# Altium schematic symbol library jlcpcb_2025_04_capacitors_extended_0805.schlib: 3281 symbols (part 14 of 18) (continued)
## GCM216R71H223JA37D
designator C?  Capacitance: 22nF  (hidden comment: *)
Capacitor, Ceramic (MLCC), 22nF, ±5%, 50V, X7R, ±5%, SMD 0805; Manufacturer: Murata Electronics; Manufacturer Part Number: GCM216R71H223JA37D; Package Size: 0805; JLCPCB Basic Part: No; JLCPCB Part Number: C437478; Supplier 1: LCSC; Category: Capacitors - MLCC; Supplier Part Number 1: C437478; Tolerance: ±5%; Voltage Rating: 50V; Temperature Coefficient: X7R; RoHS: Yes; ComponentLink1Description: Datasheet; ComponentLink1URL: https://wmsc.lcsc.com/wmsc/upload/file/pdf/v2/lcsc/2304140030_Murata-Electronics-GCM216R71H223JA37D_C437478.pdf; ComponentLink2Description: JLCPCB Part URL; ComponentLink2URL: https://jlcpcb.com/partdetail/C437478; ComponentLink3Description: LCSC Part URL; ComponentLink3URL: https://lcsc.com/product-detail/Multilayer-Ceramic-Capacitors-MLCC---SMD-SMT_Murata-Electronics-Murata-Electronics-GCM216R71H223JA37D_C437478.html
footprint CAP-0805 (0805 (2012M) Capacitor)
pins: 1, 2

## GCM216R71H223KA37D
designator C?  Capacitance: 22nF  (hidden comment: *)
Capacitor, Ceramic (MLCC), 22nF, ±10%, 50V, X7R, ±10%, SMD 0805; Manufacturer: Murata Electronics; Manufacturer Part Number: GCM216R71H223KA37D; Package Size: 0805; JLCPCB Basic Part: No; JLCPCB Part Number: C343871; Supplier 1: LCSC; Category: Capacitors - MLCC; Supplier Part Number 1: C343871; Tolerance: ±10%; Voltage Rating: 50V; Temperature Coefficient: X7R; RoHS: Yes; ComponentLink1Description: Datasheet; ComponentLink1URL: https://wmsc.lcsc.com/wmsc/upload/file/pdf/v2/lcsc/1912111437_Murata-Electronics-GCM216R71H223KA37D_C343871.pdf; ComponentLink2Description: JLCPCB Part URL; ComponentLink2URL: https://jlcpcb.com/partdetail/C343871; ComponentLink3Description: LCSC Part URL; ComponentLink3URL: https://lcsc.com/product-detail/Multilayer-Ceramic-Capacitors-MLCC---SMD-SMT_Murata-Electronics-Murata-Electronics-GCM216R71H223KA37D_C343871.html
footprint CAP-0805 (0805 (2012M) Capacitor)
pins: 1, 2

## GCM216R72A103KA37D
designator C?  Capacitance: 10nF  (hidden comment: *)
Capacitor, Ceramic (MLCC), 10nF, ±10%, 100V, X7R, ±10%, SMD 0805; Manufacturer: Murata Electronics; Manufacturer Part Number: GCM216R72A103KA37D; Package Size: 0805; JLCPCB Basic Part: No; JLCPCB Part Number: C469523; Supplier 1: LCSC; Category: Capacitors - MLCC; Supplier Part Number 1: C469523; Tolerance: ±10%; Voltage Rating: 100V; Temperature Coefficient: X7R; RoHS: Yes; ComponentLink1Description: Datasheet; ComponentLink1URL: https://wmsc.lcsc.com/wmsc/upload/file/pdf/v2/lcsc/1912251532_Murata-Electronics-GCM216R72A103KA37D_C469523.pdf; ComponentLink2Description: JLCPCB Part URL; ComponentLink2URL: https://jlcpcb.com/partdetail/C469523; ComponentLink3Description: LCSC Part URL; ComponentLink3URL: https://lcsc.com/product-detail/Multilayer-Ceramic-Capacitors-MLCC---SMD-SMT_Murata-Electronics-Murata-Electronics-GCM216R72A103KA37D_C469523.html
footprint CAP-0805 (0805 (2012M) Capacitor)
pins: 1, 2

## GCM216R72A223KA37D
designator C?  Capacitance: 22nF  (hidden comment: *)
Capacitor, Ceramic (MLCC), 22nF, ±10%, 100V, X7R, ±10%, SMD 0805; Manufacturer: Murata Electronics; Manufacturer Part Number: GCM216R72A223KA37D; Package Size: 0805; JLCPCB Basic Part: No; JLCPCB Part Number: C184772; Supplier 1: LCSC; Category: Capacitors - MLCC; Supplier Part Number 1: C184772; Tolerance: ±10%; Voltage Rating: 100V; Temperature Coefficient: X7R; RoHS: Yes; ComponentLink1Description: Datasheet; ComponentLink1URL: https://wmsc.lcsc.com/wmsc/upload/file/pdf/v2/lcsc/1912111437_Murata-Electronics-GCM216R72A223KA37D_C184772.pdf; ComponentLink2Description: JLCPCB Part URL; ComponentLink2URL: https://jlcpcb.com/partdetail/C184772; ComponentLink3Description: LCSC Part URL; ComponentLink3URL: https://lcsc.com/product-detail/Multilayer-Ceramic-Capacitors-MLCC---SMD-SMT_Murata-Electronics-Murata-Electronics-GCM216R72A223KA37D_C184772.html
footprint CAP-0805 (0805 (2012M) Capacitor)
pins: 1, 2

## GCM219R71C105KA37D
designator C?  Capacitance: 1uF  (hidden comment: *)
Capacitor, Ceramic (MLCC), 1uF, ±10%, 16V, X7R, ±10%, SMD 0805; Manufacturer: Murata Electronics; Manufacturer Part Number: GCM219R71C105KA37D; Package Size: 0805; JLCPCB Basic Part: No; JLCPCB Part Number: C2167390; Supplier 1: LCSC; Category: Capacitors - MLCC; Supplier Part Number 1: C2167390; Tolerance: ±10%; Voltage Rating: 16V; Temperature Coefficient: X7R; RoHS: Yes; ComponentLink1Description: Datasheet; ComponentLink1URL: https://wmsc.lcsc.com/wmsc/upload/file/pdf/v2/lcsc/2308111607_Murata-Electronics-GCM219R71C105KA37D_C2167390.pdf; ComponentLink2Description: JLCPCB Part URL; ComponentLink2URL: https://jlcpcb.com/partdetail/C2167390; ComponentLink3Description: LCSC Part URL; ComponentLink3URL: https://lcsc.com/product-detail/Multilayer-Ceramic-Capacitors-MLCC---SMD-SMT_Murata-Electronics-Murata-Electronics-GCM219R71C105KA37D_C2167390.html
footprint CAP-0805 (0805 (2012M) Capacitor)
pins: 1, 2

## GCM219R71E474KA55D
designator C?  Capacitance: 470nF  (hidden comment: *)
Capacitor, Ceramic (MLCC), 470nF, ±10%, 25V, X7R, ±10%, SMD 0805; Manufacturer: Murata Electronics; Manufacturer Part Number: GCM219R71E474KA55D; Package Size: 0805; JLCPCB Basic Part: No; JLCPCB Part Number: C437481; Supplier 1: LCSC; Category: Capacitors - MLCC; Supplier Part Number 1: C437481; Tolerance: ±10%; Voltage Rating: 25V; Temperature Coefficient: X7R; RoHS: Yes; ComponentLink1Description: Datasheet; ComponentLink1URL: https://wmsc.lcsc.com/wmsc/upload/file/pdf/v2/lcsc/2304140030_Murata-Electronics-GCM219R71E474KA55D_C437481.pdf; ComponentLink2Description: JLCPCB Part URL; ComponentLink2URL: https://jlcpcb.com/partdetail/C437481; ComponentLink3Description: LCSC Part URL; ComponentLink3URL: https://lcsc.com/product-detail/Multilayer-Ceramic-Capacitors-MLCC---SMD-SMT_Murata-Electronics-Murata-Electronics-GCM219R71E474KA55D_C437481.html
footprint CAP-0805 (0805 (2012M) Capacitor)
pins: 1, 2

## GCM219R71H333KA37D
designator C?  Capacitance: 33nF  (hidden comment: *)
Capacitor, Ceramic (MLCC), 33nF, ±10%, 50V, X7R, ±10%, SMD 0805; Manufacturer: Murata Electronics; Manufacturer Part Number: GCM219R71H333KA37D; Package Size: 0805; JLCPCB Basic Part: No; JLCPCB Part Number: C437482; Supplier 1: LCSC; Category: Capacitors - MLCC; Supplier Part Number 1: C437482; Tolerance: ±10%; Voltage Rating: 50V; Temperature Coefficient: X7R; RoHS: Yes; ComponentLink1Description: Datasheet; ComponentLink1URL: https://wmsc.lcsc.com/wmsc/upload/file/pdf/v2/lcsc/2304140030_Murata-Electronics-GCM219R71H333KA37D_C437482.pdf; ComponentLink2Description: JLCPCB Part URL; ComponentLink2URL: https://jlcpcb.com/partdetail/C437482; ComponentLink3Description: LCSC Part URL; ComponentLink3URL: https://lcsc.com/product-detail/Multilayer-Ceramic-Capacitors-MLCC---SMD-SMT_Murata-Electronics-Murata-Electronics-GCM219R71H333KA37D_C437482.html
footprint CAP-0805 (0805 (2012M) Capacitor)
pins: 1, 2

## GCM219R71H334KA55D
designator C?  Capacitance: 330nF  (hidden comment: *)
Capacitor, Ceramic (MLCC), 330nF, ±10%, 50V, X7R, ±10%, SMD 0805; Manufacturer: Murata Electronics; Manufacturer Part Number: GCM219R71H334KA55D; Package Size: 0805; JLCPCB Basic Part: No; JLCPCB Part Number: C161253; Supplier 1: LCSC; Category: Capacitors - MLCC; Supplier Part Number 1: C161253; Tolerance: ±10%; Voltage Rating: 50V; Temperature Coefficient: X7R; RoHS: Yes; ComponentLink1Description: Datasheet; ComponentLink1URL: https://wmsc.lcsc.com/wmsc/upload/file/pdf/v2/lcsc/1810251040_Murata-Electronics-GCM219R71H334KA55D_C161253.pdf; ComponentLink2Description: JLCPCB Part URL; ComponentLink2URL: https://jlcpcb.com/partdetail/C161253; ComponentLink3Description: LCSC Part URL; ComponentLink3URL: https://lcsc.com/product-detail/Multilayer-Ceramic-Capacitors-MLCC---SMD-SMT_Murata-Electronics-Murata-Electronics-GCM219R71H334KA55D_C161253.html
footprint CAP-0805 (0805 (2012M) Capacitor)
pins: 1, 2

## GCM219R72A102KA37D
designator C?  Capacitance: 1nF  (hidden comment: *)
Capacitor, Ceramic (MLCC), 1nF, ±10%, 100V, X7R, ±10%, SMD 0805; Manufacturer: Murata Electronics; Manufacturer Part Number: GCM219R72A102KA37D; Package Size: 0805; JLCPCB Basic Part: No; JLCPCB Part Number: C161254; Supplier 1: LCSC; Category: Capacitors - MLCC; Supplier Part Number 1: C161254; Tolerance: ±10%; Voltage Rating: 100V; Temperature Coefficient: X7R; RoHS: Yes; ComponentLink1Description: Datasheet; ComponentLink1URL: https://wmsc.lcsc.com/wmsc/upload/file/pdf/v2/lcsc/1810251040_Murata-Electronics-GCM219R72A102KA37D_C161254.pdf; ComponentLink2Description: JLCPCB Part URL; ComponentLink2URL: https://jlcpcb.com/partdetail/C161254; ComponentLink3Description: LCSC Part URL; ComponentLink3URL: https://lcsc.com/product-detail/Multilayer-Ceramic-Capacitors-MLCC---SMD-SMT_Murata-Electronics-Murata-Electronics-GCM219R72A102KA37D_C161254.html
footprint CAP-0805 (0805 (2012M) Capacitor)
pins: 1, 2

## GCM219R72A333KA37D
designator C?  Capacitance: 33nF  (hidden comment: *)
Capacitor, Ceramic (MLCC), 33nF, ±10%, 100V, X7R, ±10%, SMD 0805; Manufacturer: Murata Electronics; Manufacturer Part Number: GCM219R72A333KA37D; Package Size: 0805; JLCPCB Basic Part: No; JLCPCB Part Number: C161255; Supplier 1: LCSC; Category: Capacitors - MLCC; Supplier Part Number 1: C161255; Tolerance: ±10%; Voltage Rating: 100V; Temperature Coefficient: X7R; RoHS: Yes; ComponentLink1Description: Datasheet; ComponentLink1URL: https://wmsc.lcsc.com/wmsc/upload/file/pdf/v2/lcsc/1810251040_Murata-Electronics-GCM219R72A333KA37D_C161255.pdf; ComponentLink2Description: JLCPCB Part URL; ComponentLink2URL: https://jlcpcb.com/partdetail/C161255; ComponentLink3Description: LCSC Part URL; ComponentLink3URL: https://lcsc.com/product-detail/Multilayer-Ceramic-Capacitors-MLCC---SMD-SMT_Murata-Electronics-Murata-Electronics-GCM219R72A333KA37D_C161255.html
footprint CAP-0805 (0805 (2012M) Capacitor)
pins: 1, 2

## GCM219R91H103KA37D
designator C?  Capacitance: 10nF  (hidden comment: *)
Capacitor, Ceramic (MLCC), 10nF, ±10%, 50V, X8R, ±10%, SMD 0805; Manufacturer: Murata Electronics; Manufacturer Part Number: GCM219R91H103KA37D; Package Size: 0805; JLCPCB Basic Part: No; JLCPCB Part Number: C437483; Supplier 1: LCSC; Category: Capacitors - MLCC; Supplier Part Number 1: C437483; Tolerance: ±10%; Voltage Rating: 50V; Temperature Coefficient: X8R; RoHS: Yes; ComponentLink1Description: Datasheet; ComponentLink1URL: https://wmsc.lcsc.com/wmsc/upload/file/pdf/v2/lcsc/2304140030_Murata-Electronics-GCM219R91H103KA37D_C437483.pdf; ComponentLink2Description: JLCPCB Part URL; ComponentLink2URL: https://jlcpcb.com/partdetail/C437483; ComponentLink3Description: LCSC Part URL; ComponentLink3URL: https://lcsc.com/product-detail/Multilayer-Ceramic-Capacitors-MLCC---SMD-SMT_Murata-Electronics-Murata-Electronics-GCM219R91H103KA37D_C437483.html
footprint CAP-0805 (0805 (2012M) Capacitor)
pins: 1, 2

## GCM219R92A223KA37D
designator C?  Capacitance: 22nF  (hidden comment: *)
Capacitor, Ceramic (MLCC), 22nF, ±10%, 100V, ±10%, SMD 0805; Manufacturer: Murata Electronics; Manufacturer Part Number: GCM219R92A223KA37D; Package Size: 0805; JLCPCB Basic Part: No; JLCPCB Part Number: C1517528; Supplier 1: LCSC; Category: Capacitors - MLCC; Supplier Part Number 1: C1517528; Tolerance: ±10%; Voltage Rating: 100V; RoHS: Yes; ComponentLink1Description: Datasheet; ComponentLink1URL: https://wmsc.lcsc.com/wmsc/upload/file/pdf/v2/lcsc/2108202030_Murata-Electronics-GCM219R92A223KA37D_C1517528.pdf; ComponentLink2Description: JLCPCB Part URL; ComponentLink2URL: https://jlcpcb.com/partdetail/C1517528; ComponentLink3Description: LCSC Part URL; ComponentLink3URL: https://lcsc.com/product-detail/Multilayer-Ceramic-Capacitors-MLCC---SMD-SMT_Murata-Electronics-Murata-Electronics-GCM219R92A223KA37D_C1517528.html
footprint CAP-0805 (0805 (2012M) Capacitor)
pins: 1, 2

## GCM2162C2A152JA01D
designator C?  Capacitance: 1.5nF  (hidden comment: *)
Capacitor, Ceramic (MLCC), 1.5nF, ±5%, 100V, CH, ±5%, SMD 0805; Manufacturer: Murata Electronics; Manufacturer Part Number: GCM2162C2A152JA01D; Package Size: 0805; JLCPCB Basic Part: No; JLCPCB Part Number: C380381; Supplier 1: LCSC; Category: Capacitors - MLCC; Supplier Part Number 1: C380381; Tolerance: ±5%; Voltage Rating: 100V; Temperature Coefficient: CH; RoHS: Yes; ComponentLink1Description: Datasheet; ComponentLink1URL: https://wmsc.lcsc.com/wmsc/upload/file/pdf/v2/lcsc/2005291032_Murata-Electronics-GCM2162C2A152JA01D_C380381.pdf; ComponentLink2Description: JLCPCB Part URL; ComponentLink2URL: https://jlcpcb.com/partdetail/C380381; ComponentLink3Description: LCSC Part URL; ComponentLink3URL: https://lcsc.com/product-detail/Multilayer-Ceramic-Capacitors-MLCC---SMD-SMT_Murata-Electronics-Murata-Electronics-GCM2162C2A152JA01D_C380381.html
footprint CAP-0805 (0805 (2012M) Capacitor)
pins: 1, 2

## GCM2165C1H681JA16D
designator C?  Capacitance: 680pF  (hidden comment: *)
Capacitor, Ceramic (MLCC), 680pF, ±5%, 50V, C0G, ±5%, SMD 0805; Manufacturer: Murata Electronics; Manufacturer Part Number: GCM2165C1H681JA16D; Package Size: 0805; JLCPCB Basic Part: No; JLCPCB Part Number: C437471; Supplier 1: LCSC; Category: Capacitors - MLCC; Supplier Part Number 1: C437471; Tolerance: ±5%; Voltage Rating: 50V; Temperature Coefficient: C0G; RoHS: Yes; ComponentLink1Description: Datasheet; ComponentLink1URL: https://wmsc.lcsc.com/wmsc/upload/file/pdf/v2/lcsc/2304140030_Murata-Electronics-GCM2165C1H681JA16D_C437471.pdf; ComponentLink2Description: JLCPCB Part URL; ComponentLink2URL: https://jlcpcb.com/partdetail/C437471; ComponentLink3Description: LCSC Part URL; ComponentLink3URL: https://lcsc.com/product-detail/Multilayer-Ceramic-Capacitors-MLCC---SMD-SMT_Murata-Electronics-Murata-Electronics-GCM2165C1H681JA16D_C437471.html
footprint CAP-0805 (0805 (2012M) Capacitor)
pins: 1, 2

## GCM2165C2A221JA16D
designator C?  Capacitance: 220pF  (hidden comment: *)
Capacitor, Ceramic (MLCC), 220pF, ±5%, 100V, ±5%, SMD 0805; Manufacturer: Murata Electronics; Manufacturer Part Number: GCM2165C2A221JA16D; Package Size: 0805; JLCPCB Basic Part: No; JLCPCB Part Number: C701167; Supplier 1: LCSC; Category: Capacitors - MLCC; Supplier Part Number 1: C701167; Tolerance: ±5%; Voltage Rating: 100V; RoHS: Yes; ComponentLink1Description: Datasheet; ComponentLink1URL: https://wmsc.lcsc.com/wmsc/upload/file/pdf/v2/lcsc/2010051234_Murata-Electronics-GCM2165C2A221JA16D_C701167.pdf; ComponentLink2Description: JLCPCB Part URL; ComponentLink2URL: https://jlcpcb.com/partdetail/C701167; ComponentLink3Description: LCSC Part URL; ComponentLink3URL: https://lcsc.com/product-detail/Multilayer-Ceramic-Capacitors-MLCC---SMD-SMT_Murata-Electronics-Murata-Electronics-GCM2165C2A221JA16D_C701167.html
footprint CAP-0805 (0805 (2012M) Capacitor)
pins: 1, 2

## GCM2165C2A222JA16D
designator C?  Capacitance: 2.2nF  (hidden comment: *)
Capacitor, Ceramic (MLCC), 2.2nF, ±5%, 100V, C0G, ±5%, SMD 0805; Manufacturer: Murata Electronics; Manufacturer Part Number: GCM2165C2A222JA16D; Package Size: 0805; JLCPCB Basic Part: No; JLCPCB Part Number: C161241; Supplier 1: LCSC; Category: Capacitors - MLCC; Supplier Part Number 1: C161241; Tolerance: ±5%; Voltage Rating: 100V; Temperature Coefficient: C0G; RoHS: Yes; ComponentLink1Description: Datasheet; ComponentLink1URL: https://wmsc.lcsc.com/wmsc/upload/file/pdf/v2/lcsc/1810201252_Murata-Electronics-GCM2165C2A222JA16D_C161241.pdf; ComponentLink2Description: JLCPCB Part URL; ComponentLink2URL: https://jlcpcb.com/partdetail/C161241; ComponentLink3Description: LCSC Part URL; ComponentLink3URL: https://lcsc.com/product-detail/Multilayer-Ceramic-Capacitors-MLCC---SMD-SMT_Murata-Electronics-Murata-Electronics-GCM2165C2A222JA16D_C161241.html
footprint CAP-0805 (0805 (2012M) Capacitor)
pins: 1, 2

## GCM2165C2A471JA16D
designator C?  Capacitance: 470pF  (hidden comment: *)
Capacitor, Ceramic (MLCC), 470pF, ±5%, 100V, C0G, ±5%, SMD 0805; Manufacturer: Murata Electronics; Manufacturer Part Number: GCM2165C2A471JA16D; Package Size: 0805; JLCPCB Basic Part: No; JLCPCB Part Number: C437474; Supplier 1: LCSC; Category: Capacitors - MLCC; Supplier Part Number 1: C437474; Tolerance: ±5%; Voltage Rating: 100V; Temperature Coefficient: C0G; RoHS: Yes; ComponentLink1Description: Datasheet; ComponentLink1URL: https://wmsc.lcsc.com/wmsc/upload/file/pdf/v2/lcsc/2304140030_Murata-Electronics-GCM2165C2A471JA16D_C437474.pdf; ComponentLink2Description: JLCPCB Part URL; ComponentLink2URL: https://jlcpcb.com/partdetail/C437474; ComponentLink3Description: LCSC Part URL; ComponentLink3URL: https://lcsc.com/product-detail/Multilayer-Ceramic-Capacitors-MLCC---SMD-SMT_Murata-Electronics-Murata-Electronics-GCM2165C2A471JA16D_C437474.html
footprint CAP-0805 (0805 (2012M) Capacitor)
pins: 1, 2

## GCM2195C1H102JA16D
designator C?  Capacitance: 1nF  (hidden comment: *)
Capacitor, Ceramic (MLCC), 1nF, ±5%, 50V, C0G, ±5%, SMD 0805; Manufacturer: Murata Electronics; Manufacturer Part Number: GCM2195C1H102JA16D; Package Size: 0805; JLCPCB Basic Part: No; JLCPCB Part Number: C393688; Supplier 1: LCSC; Category: Capacitors - MLCC; Supplier Part Number 1: C393688; Tolerance: ±5%; Voltage Rating: 50V; Temperature Coefficient: C0G; RoHS: Yes; ComponentLink1Description: Datasheet; ComponentLink1URL: https://wmsc.lcsc.com/wmsc/upload/file/pdf/v2/lcsc/1912111437_Murata-Electronics-GCM2195C1H102JA16D_C393688.pdf; ComponentLink2Description: JLCPCB Part URL; ComponentLink2URL: https://jlcpcb.com/partdetail/C393688; ComponentLink3Description: LCSC Part URL; ComponentLink3URL: https://lcsc.com/product-detail/Multilayer-Ceramic-Capacitors-MLCC---SMD-SMT_Murata-Electronics-Murata-Electronics-GCM2195C1H102JA16D_C393688.html
footprint CAP-0805 (0805 (2012M) Capacitor)
pins: 1, 2

## GCM2195C1H103JA16D
designator C?  Capacitance: 10nF  (hidden comment: *)
Capacitor, Ceramic (MLCC), 10nF, ±5%, 50V, C0G, ±5%, SMD 0805; Manufacturer: Murata Electronics; Manufacturer Part Number: GCM2195C1H103JA16D; Package Size: 0805; JLCPCB Basic Part: No; JLCPCB Part Number: C161250; Supplier 1: LCSC; Category: Capacitors - MLCC; Supplier Part Number 1: C161250; Tolerance: ±5%; Voltage Rating: 50V; Temperature Coefficient: C0G; RoHS: Yes; ComponentLink1Description: Datasheet; ComponentLink1URL: https://wmsc.lcsc.com/wmsc/upload/file/pdf/v2/lcsc/1810251040_Murata-Electronics-GCM2195C1H103JA16D_C161250.pdf; ComponentLink2Description: JLCPCB Part URL; ComponentLink2URL: https://jlcpcb.com/partdetail/C161250; ComponentLink3Description: LCSC Part URL; ComponentLink3URL: https://lcsc.com/product-detail/Multilayer-Ceramic-Capacitors-MLCC---SMD-SMT_Murata-Electronics-Murata-Electronics-GCM2195C1H103JA16D_C161250.html
footprint CAP-0805 (0805 (2012M) Capacitor)
pins: 1, 2

## GCM2195C1H123GA16D
designator C?  Capacitance: 12nF  (hidden comment: *)
Capacitor, Ceramic (MLCC), 12nF, ±2%, 50V, ±2%, SMD 0805; Manufacturer: Murata Electronics; Manufacturer Part Number: GCM2195C1H123GA16D; Package Size: 0805; JLCPCB Basic Part: No; JLCPCB Part Number: C909835; Supplier 1: LCSC; Category: Capacitors - MLCC; Supplier Part Number 1: C909835; Tolerance: ±2%; Voltage Rating: 50V; RoHS: Yes; ComponentLink1Description: Datasheet; ComponentLink1URL: https://wmsc.lcsc.com/wmsc/upload/file/pdf/v2/lcsc/2304140030_Murata-Electronics-GCM2195C1H123GA16D_C909835.pdf; ComponentLink2Description: JLCPCB Part URL; ComponentLink2URL: https://jlcpcb.com/partdetail/C909835; ComponentLink3Description: LCSC Part URL; ComponentLink3URL: https://lcsc.com/product-detail/Multilayer-Ceramic-Capacitors-MLCC---SMD-SMT_Murata-Electronics-Murata-Electronics-GCM2195C1H123GA16D_C909835.html
footprint CAP-0805 (0805 (2012M) Capacitor)
pins: 1, 2

## GCM2195C1H153JA16D
designator C?  Capacitance: 15nF  (hidden comment: *)
Capacitor, Ceramic (MLCC), 15nF, ±5%, 50V, C0G, ±5%, SMD 0805; Manufacturer: Murata Electronics; Manufacturer Part Number: GCM2195C1H153JA16D; Package Size: 0805; JLCPCB Basic Part: No; JLCPCB Part Number: C161251; Supplier 1: LCSC; Category: Capacitors - MLCC; Supplier Part Number 1: C161251; Tolerance: ±5%; Voltage Rating: 50V; Temperature Coefficient: C0G; RoHS: Yes; ComponentLink1Description: Datasheet; ComponentLink1URL: https://wmsc.lcsc.com/wmsc/upload/file/pdf/v2/lcsc/1810201331_Murata-Electronics-GCM2195C1H153JA16D_C161251.pdf; ComponentLink2Description: JLCPCB Part URL; ComponentLink2URL: https://jlcpcb.com/partdetail/C161251; ComponentLink3Description: LCSC Part URL; ComponentLink3URL: https://lcsc.com/product-detail/Multilayer-Ceramic-Capacitors-MLCC---SMD-SMT_Murata-Electronics-Murata-Electronics-GCM2195C1H153JA16D_C161251.html
footprint CAP-0805 (0805 (2012M) Capacitor)
pins: 1, 2

## GJ821BR61E106KE11L
designator C?  Capacitance: 10uF  (hidden comment: *)
Capacitor, Ceramic (MLCC), 10uF, ±10%, 25V, X5R, ±10%, SMD 0805; Manufacturer: Murata Electronics; Manufacturer Part Number: GJ821BR61E106KE11L; Package Size: 0805; JLCPCB Basic Part: No; JLCPCB Part Number: C471371; Supplier 1: LCSC; Category: Capacitors - MLCC; Supplier Part Number 1: C471371; Tolerance: ±10%; Voltage Rating: 25V; Temperature Coefficient: X5R; RoHS: Yes; ComponentLink1Description: Datasheet; ComponentLink1URL: https://wmsc.lcsc.com/wmsc/upload/file/pdf/v2/lcsc/2001071133_Murata-Electronics-GJ821BR61E106KE11L_C471371.pdf; ComponentLink2Description: JLCPCB Part URL; ComponentLink2URL: https://jlcpcb.com/partdetail/C471371; ComponentLink3Description: LCSC Part URL; ComponentLink3URL: https://lcsc.com/product-detail/Multilayer-Ceramic-Capacitors-MLCC---SMD-SMT_Murata-Electronics-Murata-Electronics-GJ821BR61E106KE11L_C471371.html
footprint CAP-0805 (0805 (2012M) Capacitor)
pins: 1, 2

## GMK212B7105MGHT
designator C?  Capacitance: 1uF  (hidden comment: *)
Capacitor, Ceramic (MLCC), 1uF, ±20%, 35V, X7R, ±20%, SMD 0805; Manufacturer: Taiyo Yuden; Manufacturer Part Number: GMK212B7105MGHT; Package Size: 0805; JLCPCB Basic Part: No; JLCPCB Part Number: C2217678; Supplier 1: LCSC; Category: Capacitors - MLCC; Supplier Part Number 1: C2217678; Tolerance: ±20%; Voltage Rating: 35V; Temperature Coefficient: X7R; RoHS: Yes; ComponentLink1Description: Datasheet; ComponentLink1URL: https://wmsc.lcsc.com/wmsc/upload/file/pdf/v2/lcsc/2211281930_Taiyo-Yuden-GMK212B7105MGHT_C2217678.pdf; ComponentLink2Description: JLCPCB Part URL; ComponentLink2URL: https://jlcpcb.com/partdetail/C2217678; ComponentLink3Description: LCSC Part URL; ComponentLink3URL: https://lcsc.com/product-detail/Multilayer-Ceramic-Capacitors-MLCC---SMD-SMT_Taiyo-Yuden-Taiyo-Yuden-GMK212B7105MGHT_C2217678.html
footprint CAP-0805 (0805 (2012M) Capacitor)
pins: 1, 2

## GMK212B7334KG-T
designator C?  Capacitance: 330nF  (hidden comment: *)
Capacitor, Ceramic (MLCC), 330nF, ±10%, 35V, X7R, ±10%, SMD 0805; Manufacturer: Taiyo Yuden; Manufacturer Part Number: GMK212B7334KG-T; Package Size: 0805; JLCPCB Basic Part: No; JLCPCB Part Number: C524972; Supplier 1: LCSC; Category: Capacitors - MLCC; Supplier Part Number 1: C524972; Tolerance: ±10%; Voltage Rating: 35V; Temperature Coefficient: X7R; RoHS: Yes; ComponentLink1Description: Datasheet; ComponentLink1URL: https://wmsc.lcsc.com/wmsc/upload/file/pdf/v2/lcsc/2211282200_Taiyo-Yuden-GMK212B7334KG-T_C524972.pdf; ComponentLink2Description: JLCPCB Part URL; ComponentLink2URL: https://jlcpcb.com/partdetail/C524972; ComponentLink3Description: LCSC Part URL; ComponentLink3URL: https://lcsc.com/product-detail/Multilayer-Ceramic-Capacitors-MLCC---SMD-SMT_Taiyo-Yuden-Taiyo-Yuden-GMK212B7334KG-T_C524972.html
footprint CAP-0805 (0805 (2012M) Capacitor)
pins: 1, 2

## GMK212BBJ106KG-T
designator C?  Capacitance: 10uF  (hidden comment: *)
Capacitor, Ceramic (MLCC), 10uF, ±10%, 35V, X5R, ±10%, SMD 0805; Manufacturer: Taiyo Yuden; Manufacturer Part Number: GMK212BBJ106KG-T; Package Size: 0805; JLCPCB Basic Part: No; JLCPCB Part Number: C2167569; Supplier 1: LCSC; Category: Capacitors - MLCC; Supplier Part Number 1: C2167569; Tolerance: ±10%; Voltage Rating: 35V; Temperature Coefficient: X5R; RoHS: Yes; ComponentLink1Description: Datasheet; ComponentLink1URL: https://wmsc.lcsc.com/wmsc/upload/file/pdf/v2/lcsc/2211282030_Taiyo-Yuden-GMK212BBJ106KG-T_C2167569.pdf; ComponentLink2Description: JLCPCB Part URL; ComponentLink2URL: https://jlcpcb.com/partdetail/C2167569; ComponentLink3Description: LCSC Part URL; ComponentLink3URL: https://lcsc.com/product-detail/Multilayer-Ceramic-Capacitors-MLCC---SMD-SMT_Taiyo-Yuden-Taiyo-Yuden-GMK212BBJ106KG-T_C2167569.html
footprint CAP-0805 (0805 (2012M) Capacitor)
pins: 1, 2

## GMK212BBJ106MG-T
designator C?  Capacitance: 10uF  (hidden comment: *)
Capacitor, Ceramic (MLCC), 10uF, ±20%, 35V, X5R, ±20%, SMD 0805; Manufacturer: Taiyo Yuden; Manufacturer Part Number: GMK212BBJ106MG-T; Package Size: 0805; JLCPCB Basic Part: No; JLCPCB Part Number: C3872744; Supplier 1: LCSC; Category: Capacitors - MLCC; Supplier Part Number 1: C3872744; Tolerance: ±20%; Voltage Rating: 35V; Temperature Coefficient: X5R; RoHS: Yes; ComponentLink1Description: Datasheet; ComponentLink1URL: https://wmsc.lcsc.com/wmsc/upload/file/pdf/v2/lcsc/2211281730_Taiyo-Yuden-GMK212BBJ106MG-T_C3872744.pdf; ComponentLink2Description: JLCPCB Part URL; ComponentLink2URL: https://jlcpcb.com/partdetail/C3872744; ComponentLink3Description: LCSC Part URL; ComponentLink3URL: https://lcsc.com/product-detail/Multilayer-Ceramic-Capacitors-MLCC---SMD-SMT_Taiyo-Yuden-Taiyo-Yuden-GMK212BBJ106MG-T_C3872744.html
footprint CAP-0805 (0805 (2012M) Capacitor)
pins: 1, 2

## GMK212BJ104KGHT
designator C?  Capacitance: 100nF  (hidden comment: *)
Capacitor, Ceramic (MLCC), 100nF, ±10%, 35V, X5R, ±10%, SMD 0805; Manufacturer: Taiyo Yuden; Manufacturer Part Number: GMK212BJ104KGHT; Package Size: 0805; JLCPCB Basic Part: No; JLCPCB Part Number: C525005; Supplier 1: LCSC; Category: Capacitors - MLCC; Supplier Part Number 1: C525005; Tolerance: ±10%; Voltage Rating: 35V; Temperature Coefficient: X5R; RoHS: Yes; ComponentLink1Description: Datasheet; ComponentLink1URL: https://wmsc.lcsc.com/wmsc/upload/file/pdf/v2/lcsc/2304140030_Taiyo-Yuden-GMK212BJ104KGHT_C525005.pdf; ComponentLink2Description: JLCPCB Part URL; ComponentLink2URL: https://jlcpcb.com/partdetail/C525005; ComponentLink3Description: LCSC Part URL; ComponentLink3URL: https://lcsc.com/product-detail/Multilayer-Ceramic-Capacitors-MLCC---SMD-SMT_Taiyo-Yuden-Taiyo-Yuden-GMK212BJ104KGHT_C525005.html
footprint CAP-0805 (0805 (2012M) Capacitor)
pins: 1, 2

## GQM2195C2E2R0BB12D
designator C?  Capacitance: 2pF  (hidden comment: *)
Capacitor, Ceramic (MLCC), 2pF, 250V, null, SMD 0805; Manufacturer: Murata Electronics; Manufacturer Part Number: GQM2195C2E2R0BB12D; Package Size: 0805; JLCPCB Basic Part: No; JLCPCB Part Number: C237472; Supplier 1: LCSC; Category: Capacitors - MLCC; Supplier Part Number 1: C237472; Voltage Rating: 250V; Temperature Coefficient: null; RoHS: Yes; ComponentLink1Description: Datasheet; ComponentLink1URL: https://wmsc.lcsc.com/wmsc/upload/file/pdf/v2/lcsc/2303231100_Murata-Electronics-GQM2195C2E2R0BB12D_C237472.pdf; ComponentLink2Description: JLCPCB Part URL; ComponentLink2URL: https://jlcpcb.com/partdetail/C237472; ComponentLink3Description: LCSC Part URL; ComponentLink3URL: https://lcsc.com/product-detail/Multilayer-Ceramic-Capacitors-MLCC---SMD-SMT_Murata-Electronics-Murata-Electronics-GQM2195C2E2R0BB12D_C237472.html
footprint CAP-0805 (0805 (2012M) Capacitor)
pins: 1, 2

## GQM2195C2E2R7BB12D
designator C?  Capacitance: 2.7pF  (hidden comment: *)
Capacitor, Ceramic (MLCC), 2.7pF, 250V, C0G, SMD 0805; Manufacturer: Murata Electronics; Manufacturer Part Number: GQM2195C2E2R7BB12D; Package Size: 0805; JLCPCB Basic Part: No; JLCPCB Part Number: C668330; Supplier 1: LCSC; Category: Capacitors - MLCC; Supplier Part Number 1: C668330; Voltage Rating: 250V; Temperature Coefficient: C0G; RoHS: Yes; ComponentLink1Description: Datasheet; ComponentLink1URL: https://wmsc.lcsc.com/wmsc/upload/file/pdf/v2/lcsc/2202161830_Murata-Electronics-GQM2195C2E2R7BB12D_C668330.pdf; ComponentLink2Description: JLCPCB Part URL; ComponentLink2URL: https://jlcpcb.com/partdetail/C668330; ComponentLink3Description: LCSC Part URL; ComponentLink3URL: https://lcsc.com/product-detail/Multilayer-Ceramic-Capacitors-MLCC---SMD-SMT_Murata-Electronics-Murata-Electronics-GQM2195C2E2R7BB12D_C668330.html
footprint CAP-0805 (0805 (2012M) Capacitor)
pins: 1, 2

## GQM2195C2E4R3BB12D
designator C?  Capacitance: 4.3pF  (hidden comment: *)
Capacitor, Ceramic (MLCC), 4.3pF, 250V, C0G, SMD 0805; Manufacturer: Murata Electronics; Manufacturer Part Number: GQM2195C2E4R3BB12D; Package Size: 0805; JLCPCB Basic Part: No; JLCPCB Part Number: C668332; Supplier 1: LCSC; Category: Capacitors - MLCC; Supplier Part Number 1: C668332; Voltage Rating: 250V; Temperature Coefficient: C0G; RoHS: Yes; ComponentLink1Description: Datasheet; ComponentLink1URL: https://wmsc.lcsc.com/wmsc/upload/file/pdf/v2/lcsc/2202161830_Murata-Electronics-GQM2195C2E4R3BB12D_C668332.pdf; ComponentLink2Description: JLCPCB Part URL; ComponentLink2URL: https://jlcpcb.com/partdetail/C668332; ComponentLink3Description: LCSC Part URL; ComponentLink3URL: https://lcsc.com/product-detail/Multilayer-Ceramic-Capacitors-MLCC---SMD-SMT_Murata-Electronics-Murata-Electronics-GQM2195C2E4R3BB12D_C668332.html
footprint CAP-0805 (0805 (2012M) Capacitor)
pins: 1, 2

## GQM2195C2E6R8CB12D
designator C?  Capacitance: 6.8pF  (hidden comment: *)
Capacitor, Ceramic (MLCC), 6.8pF, 250V, C0G, SMD 0805; Manufacturer: Murata Electronics; Manufacturer Part Number: GQM2195C2E6R8CB12D; Package Size: 0805; JLCPCB Basic Part: No; JLCPCB Part Number: C464958; Supplier 1: LCSC; Category: Capacitors - MLCC; Supplier Part Number 1: C464958; Voltage Rating: 250V; Temperature Coefficient: C0G; RoHS: Yes; ComponentLink1Description: Datasheet; ComponentLink1URL: https://wmsc.lcsc.com/wmsc/upload/file/pdf/v2/lcsc/1912111437_Murata-Electronics-GQM2195C2E6R8CB12D_C464958.pdf; ComponentLink2Description: JLCPCB Part URL; ComponentLink2URL: https://jlcpcb.com/partdetail/C464958; ComponentLink3Description: LCSC Part URL; ComponentLink3URL: https://lcsc.com/product-detail/Multilayer-Ceramic-Capacitors-MLCC---SMD-SMT_Murata-Electronics-Murata-Electronics-GQM2195C2E6R8CB12D_C464958.html
footprint CAP-0805 (0805 (2012M) Capacitor)
pins: 1, 2

## GQM2195C2E8R2CB12D
designator C?  Capacitance: 8.2pF  (hidden comment: *)
Capacitor, Ceramic (MLCC), 8.2pF, 250V, C0G, SMD 0805; Manufacturer: Murata Electronics; Manufacturer Part Number: GQM2195C2E8R2CB12D; Package Size: 0805; JLCPCB Basic Part: No; JLCPCB Part Number: C668333; Supplier 1: LCSC; Category: Capacitors - MLCC; Supplier Part Number 1: C668333; Voltage Rating: 250V; Temperature Coefficient: C0G; RoHS: Yes; ComponentLink1Description: Datasheet; ComponentLink1URL: https://wmsc.lcsc.com/wmsc/upload/file/pdf/v2/lcsc/2202161830_Murata-Electronics-GQM2195C2E8R2CB12D_C668333.pdf; ComponentLink2Description: JLCPCB Part URL; ComponentLink2URL: https://jlcpcb.com/partdetail/C668333; ComponentLink3Description: LCSC Part URL; ComponentLink3URL: https://lcsc.com/product-detail/Multilayer-Ceramic-Capacitors-MLCC---SMD-SMT_Murata-Electronics-Murata-Electronics-GQM2195C2E8R2CB12D_C668333.html
footprint CAP-0805 (0805 (2012M) Capacitor)
pins: 1, 2

## GQM2195C2E120JB12D
designator C?  Capacitance: 12pF  (hidden comment: *)
Capacitor, Ceramic (MLCC), 12pF, ±5%, 250V, C0G, ±5%, SMD 0805; Manufacturer: Murata Electronics; Manufacturer Part Number: GQM2195C2E120JB12D; Package Size: 0805; JLCPCB Basic Part: No; JLCPCB Part Number: C184739; Supplier 1: LCSC; Category: Capacitors - MLCC; Supplier Part Number 1: C184739; Tolerance: ±5%; Voltage Rating: 250V; Temperature Coefficient: C0G; RoHS: Yes; ComponentLink1Description: Datasheet; ComponentLink1URL: https://wmsc.lcsc.com/wmsc/upload/file/pdf/v2/lcsc/2304140030_Murata-Electronics-GQM2195C2E120JB12D_C184739.pdf; ComponentLink2Description: JLCPCB Part URL; ComponentLink2URL: https://jlcpcb.com/partdetail/C184739; ComponentLink3Description: LCSC Part URL; ComponentLink3URL: https://lcsc.com/product-detail/Multilayer-Ceramic-Capacitors-MLCC---SMD-SMT_Murata-Electronics-Murata-Electronics-GQM2195C2E120JB12D_C184739.html
footprint CAP-0805 (0805 (2012M) Capacitor)
pins: 1, 2

## GQM2195C2E200GB12D
designator C?  Capacitance: 20pF  (hidden comment: *)
Capacitor, Ceramic (MLCC), 20pF, ±2%, 250V, null, ±2%, SMD 0805; Manufacturer: Murata Electronics; Manufacturer Part Number: GQM2195C2E200GB12D; Package Size: 0805; JLCPCB Basic Part: No; JLCPCB Part Number: C2391775; Supplier 1: LCSC; Category: Capacitors - MLCC; Supplier Part Number 1: C2391775; Tolerance: ±2%; Voltage Rating: 250V; Temperature Coefficient: null; RoHS: Yes; ComponentLink1Description: Datasheet; ComponentLink1URL: https://wmsc.lcsc.com/wmsc/upload/file/pdf/v2/lcsc/2308111731_Murata-Electronics-GQM2195C2E200GB12D_C2391775.pdf; ComponentLink2Description: JLCPCB Part URL; ComponentLink2URL: https://jlcpcb.com/partdetail/C2391775; ComponentLink3Description: LCSC Part URL; ComponentLink3URL: https://lcsc.com/product-detail/Multilayer-Ceramic-Capacitors-MLCC---SMD-SMT_Murata-Electronics-Murata-Electronics-GQM2195C2E200GB12D_C2391775.html
footprint CAP-0805 (0805 (2012M) Capacitor)
pins: 1, 2

## GQM2195C2E300GB12D
designator C?  Capacitance: 30pF  (hidden comment: *)
Capacitor, Ceramic (MLCC), 30pF, ±2%, 250V, null, ±2%, SMD 0805; Manufacturer: Murata Electronics; Manufacturer Part Number: GQM2195C2E300GB12D; Package Size: 0805; JLCPCB Basic Part: No; JLCPCB Part Number: C2387972; Supplier 1: LCSC; Category: Capacitors - MLCC; Supplier Part Number 1: C2387972; Tolerance: ±2%; Voltage Rating: 250V; Temperature Coefficient: null; RoHS: Yes; ComponentLink1Description: Datasheet; ComponentLink1URL: https://wmsc.lcsc.com/wmsc/upload/file/pdf/v2/lcsc/2308111731_Murata-Electronics-GQM2195C2E300GB12D_C2387972.pdf; ComponentLink2Description: JLCPCB Part URL; ComponentLink2URL: https://jlcpcb.com/partdetail/C2387972; ComponentLink3Description: LCSC Part URL; ComponentLink3URL: https://lcsc.com/product-detail/Multilayer-Ceramic-Capacitors-MLCC---SMD-SMT_Murata-Electronics-Murata-Electronics-GQM2195C2E300GB12D_C2387972.html
footprint CAP-0805 (0805 (2012M) Capacitor)
pins: 1, 2

## GQM2195C2E390JB12D
designator C?  Capacitance: 39pF  (hidden comment: *)
Capacitor, Ceramic (MLCC), 39pF, ±5%, 250V, C0G, ±5%, SMD 0805; Manufacturer: Murata Electronics; Manufacturer Part Number: GQM2195C2E390JB12D; Package Size: 0805; JLCPCB Basic Part: No; JLCPCB Part Number: C668331; Supplier 1: LCSC; Category: Capacitors - MLCC; Supplier Part Number 1: C668331; Tolerance: ±5%; Voltage Rating: 250V; Temperature Coefficient: C0G; RoHS: Yes; ComponentLink1Description: Datasheet; ComponentLink1URL: https://wmsc.lcsc.com/wmsc/upload/file/pdf/v2/lcsc/2202161830_Murata-Electronics-GQM2195C2E390JB12D_C668331.pdf; ComponentLink2Description: JLCPCB Part URL; ComponentLink2URL: https://jlcpcb.com/partdetail/C668331; ComponentLink3Description: LCSC Part URL; ComponentLink3URL: https://lcsc.com/product-detail/Multilayer-Ceramic-Capacitors-MLCC---SMD-SMT_Murata-Electronics-Murata-Electronics-GQM2195C2E390JB12D_C668331.html
footprint CAP-0805 (0805 (2012M) Capacitor)
pins: 1, 2

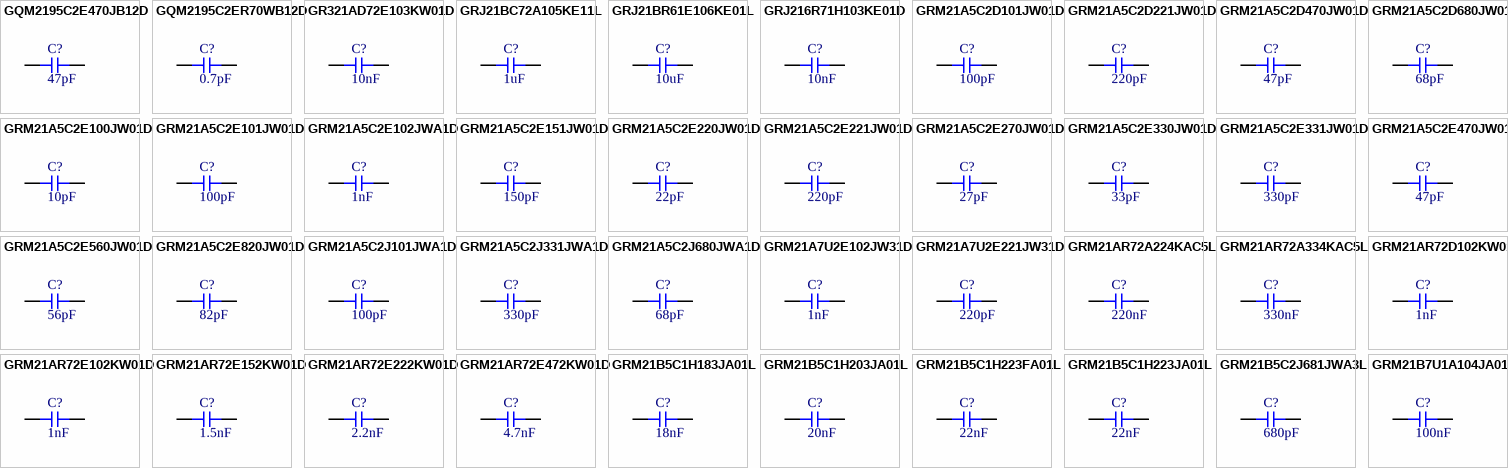
[diagram p64: symbols GQM2195C2E470JB12D to GRM21B7U1A104JA01L]

## GQM2195C2E470JB12D
designator C?  Capacitance: 47pF  (hidden comment: *)
Capacitor, Ceramic (MLCC), 47pF, ±5%, 250V, null, ±5%, SMD 0805; Manufacturer: Murata Electronics; Manufacturer Part Number: GQM2195C2E470JB12D; Package Size: 0805; JLCPCB Basic Part: No; JLCPCB Part Number: C2179874; Supplier 1: LCSC; Category: Capacitors - MLCC; Supplier Part Number 1: C2179874; Tolerance: ±5%; Voltage Rating: 250V; Temperature Coefficient: null; RoHS: Yes; ComponentLink1Description: Datasheet; ComponentLink1URL: https://wmsc.lcsc.com/wmsc/upload/file/pdf/v2/lcsc/2308111718_Murata-Electronics-GQM2195C2E470JB12D_C2179874.pdf; ComponentLink2Description: JLCPCB Part URL; ComponentLink2URL: https://jlcpcb.com/partdetail/C2179874; ComponentLink3Description: LCSC Part URL; ComponentLink3URL: https://lcsc.com/product-detail/Multilayer-Ceramic-Capacitors-MLCC---SMD-SMT_Murata-Electronics-Murata-Electronics-GQM2195C2E470JB12D_C2179874.html
footprint CAP-0805 (0805 (2012M) Capacitor)
pins: 1, 2

## GQM2195C2ER70WB12D
designator C?  Capacitance: 0.7pF  (hidden comment: *)
Capacitor, Ceramic (MLCC), 0.7pF, 250V, C0G, SMD 0805; Manufacturer: Murata Electronics; Manufacturer Part Number: GQM2195C2ER70WB12D; Package Size: 0805; JLCPCB Basic Part: No; JLCPCB Part Number: C3908487; Supplier 1: LCSC; Category: Capacitors - MLCC; Supplier Part Number 1: C3908487; Voltage Rating: 250V; Temperature Coefficient: C0G; RoHS: Yes; ComponentLink1Description: Datasheet; ComponentLink1URL: https://wmsc.lcsc.com/wmsc/upload/file/pdf/v2/lcsc/2308111808_Murata-Electronics-GQM2195C2ER70WB12D_C3908487.pdf; ComponentLink2Description: JLCPCB Part URL; ComponentLink2URL: https://jlcpcb.com/partdetail/C3908487; ComponentLink3Description: LCSC Part URL; ComponentLink3URL: https://lcsc.com/product-detail/Multilayer-Ceramic-Capacitors-MLCC---SMD-SMT_Murata-Electronics-Murata-Electronics-GQM2195C2ER70WB12D_C3908487.html
footprint CAP-0805 (0805 (2012M) Capacitor)
pins: 1, 2

## GR321AD72E103KW01D
designator C?  Capacitance: 10nF  (hidden comment: *)
Capacitor, Ceramic (MLCC), 10nF, ±10%, 250V, X7T, ±10%, SMD 0805; Manufacturer: Murata Electronics; Manufacturer Part Number: GR321AD72E103KW01D; Package Size: 0805; JLCPCB Basic Part: No; JLCPCB Part Number: C161351; Supplier 1: LCSC; Category: Capacitors - MLCC; Supplier Part Number 1: C161351; Tolerance: ±10%; Voltage Rating: 250V; Temperature Coefficient: X7T; RoHS: Yes; ComponentLink1Description: Datasheet; ComponentLink1URL: https://wmsc.lcsc.com/wmsc/upload/file/pdf/v2/lcsc/1810201249_Murata-Electronics-GR321AD72E103KW01D_C161351.pdf; ComponentLink2Description: JLCPCB Part URL; ComponentLink2URL: https://jlcpcb.com/partdetail/C161351; ComponentLink3Description: LCSC Part URL; ComponentLink3URL: https://lcsc.com/product-detail/Multilayer-Ceramic-Capacitors-MLCC---SMD-SMT_Murata-Electronics-Murata-Electronics-GR321AD72E103KW01D_C161351.html
footprint CAP-0805 (0805 (2012M) Capacitor)
pins: 1, 2

## GRJ21BC72A105KE11L
designator C?  Capacitance: 1uF  (hidden comment: *)
Capacitor, Ceramic (MLCC), 1uF, ±10%, 100V, X7S, ±10%, SMD 0805; Manufacturer: Murata Electronics; Manufacturer Part Number: GRJ21BC72A105KE11L; Package Size: 0805; JLCPCB Basic Part: No; JLCPCB Part Number: C668335; Supplier 1: LCSC; Category: Capacitors - MLCC; Supplier Part Number 1: C668335; Tolerance: ±10%; Voltage Rating: 100V; Temperature Coefficient: X7S; RoHS: Yes; ComponentLink1Description: Datasheet; ComponentLink1URL: https://wmsc.lcsc.com/wmsc/upload/file/pdf/v2/lcsc/2105241313_Murata-Electronics-GRJ21BC72A105KE11L_C668335.pdf; ComponentLink2Description: JLCPCB Part URL; ComponentLink2URL: https://jlcpcb.com/partdetail/C668335; ComponentLink3Description: LCSC Part URL; ComponentLink3URL: https://lcsc.com/product-detail/Multilayer-Ceramic-Capacitors-MLCC---SMD-SMT_Murata-Electronics-Murata-Electronics-GRJ21BC72A105KE11L_C668335.html
footprint CAP-0805 (0805 (2012M) Capacitor)
pins: 1, 2

## GRJ21BR61E106KE01L
designator C?  Capacitance: 10uF  (hidden comment: *)
Capacitor, Ceramic (MLCC), 10uF, ±10%, 25V, X5R, ±10%, SMD 0805; Manufacturer: Murata Electronics; Manufacturer Part Number: GRJ21BR61E106KE01L; Package Size: 0805; JLCPCB Basic Part: No; JLCPCB Part Number: C668336; Supplier 1: LCSC; Category: Capacitors - MLCC; Supplier Part Number 1: C668336; Tolerance: ±10%; Voltage Rating: 25V; Temperature Coefficient: X5R; RoHS: Yes; ComponentLink1Description: Datasheet; ComponentLink1URL: https://wmsc.lcsc.com/wmsc/upload/file/pdf/v2/lcsc/2109092030_Murata-Electronics-GRJ21BR61E106KE01L_C668336.pdf; ComponentLink2Description: JLCPCB Part URL; ComponentLink2URL: https://jlcpcb.com/partdetail/C668336; ComponentLink3Description: LCSC Part URL; ComponentLink3URL: https://lcsc.com/product-detail/Multilayer-Ceramic-Capacitors-MLCC---SMD-SMT_Murata-Electronics-Murata-Electronics-GRJ21BR61E106KE01L_C668336.html
footprint CAP-0805 (0805 (2012M) Capacitor)
pins: 1, 2

## GRJ216R71H103KE01D
designator C?  Capacitance: 10nF  (hidden comment: *)
Capacitor, Ceramic (MLCC), 10nF, ±10%, 50V, X7R, ±10%, SMD 0805; Manufacturer: Murata Electronics; Manufacturer Part Number: GRJ216R71H103KE01D; Package Size: 0805; JLCPCB Basic Part: No; JLCPCB Part Number: C469529; Supplier 1: LCSC; Category: Capacitors - MLCC; Supplier Part Number 1: C469529; Tolerance: ±10%; Voltage Rating: 50V; Temperature Coefficient: X7R; RoHS: Yes; ComponentLink1Description: Datasheet; ComponentLink1URL: https://wmsc.lcsc.com/wmsc/upload/file/pdf/v2/lcsc/2304140030_Murata-Electronics-GRJ216R71H103KE01D_C469529.pdf; ComponentLink2Description: JLCPCB Part URL; ComponentLink2URL: https://jlcpcb.com/partdetail/C469529; ComponentLink3Description: LCSC Part URL; ComponentLink3URL: https://lcsc.com/product-detail/Multilayer-Ceramic-Capacitors-MLCC---SMD-SMT_Murata-Electronics-Murata-Electronics-GRJ216R71H103KE01D_C469529.html
footprint CAP-0805 (0805 (2012M) Capacitor)
pins: 1, 2

## GRM21A5C2D101JW01D
designator C?  Capacitance: 100pF  (hidden comment: *)
Capacitor, Ceramic (MLCC), 100pF, ±5%, 200V, C0G, ±5%, SMD 0805; Manufacturer: Murata Electronics; Manufacturer Part Number: GRM21A5C2D101JW01D; Package Size: 0805; JLCPCB Basic Part: No; JLCPCB Part Number: C710961; Supplier 1: LCSC; Category: Capacitors - MLCC; Supplier Part Number 1: C710961; Tolerance: ±5%; Voltage Rating: 200V; Temperature Coefficient: C0G; RoHS: Yes; ComponentLink1Description: Datasheet; ComponentLink1URL: https://wmsc.lcsc.com/wmsc/upload/file/pdf/v2/lcsc/2210190600_Murata-Electronics-GRM21A5C2D101JW01D_C710961.pdf; ComponentLink2Description: JLCPCB Part URL; ComponentLink2URL: https://jlcpcb.com/partdetail/C710961; ComponentLink3Description: LCSC Part URL; ComponentLink3URL: https://lcsc.com/product-detail/Multilayer-Ceramic-Capacitors-MLCC---SMD-SMT_Murata-Electronics-Murata-Electronics-GRM21A5C2D101JW01D_C710961.html
footprint CAP-0805 (0805 (2012M) Capacitor)
pins: 1, 2

## GRM21A5C2D221JW01D
designator C?  Capacitance: 220pF  (hidden comment: *)
Capacitor, Ceramic (MLCC), 220pF, ±5%, 200V, C0G, ±5%, SMD 0805; Manufacturer: Murata Electronics; Manufacturer Part Number: GRM21A5C2D221JW01D; Package Size: 0805; JLCPCB Basic Part: No; JLCPCB Part Number: C162301; Supplier 1: LCSC; Category: Capacitors - MLCC; Supplier Part Number 1: C162301; Tolerance: ±5%; Voltage Rating: 200V; Temperature Coefficient: C0G; RoHS: Yes; ComponentLink1Description: Datasheet; ComponentLink1URL: https://wmsc.lcsc.com/wmsc/upload/file/pdf/v2/lcsc/1810201235_Murata-Electronics-GRM21A5C2D221JW01D_C162301.pdf; ComponentLink2Description: JLCPCB Part URL; ComponentLink2URL: https://jlcpcb.com/partdetail/C162301; ComponentLink3Description: LCSC Part URL; ComponentLink3URL: https://lcsc.com/product-detail/Multilayer-Ceramic-Capacitors-MLCC---SMD-SMT_Murata-Electronics-Murata-Electronics-GRM21A5C2D221JW01D_C162301.html
footprint CAP-0805 (0805 (2012M) Capacitor)
pins: 1, 2

## GRM21A5C2D470JW01D
designator C?  Capacitance: 47pF  (hidden comment: *)
Capacitor, Ceramic (MLCC), 47pF, ±5%, 200V, C0G, ±5%, SMD 0805; Manufacturer: Murata Electronics; Manufacturer Part Number: GRM21A5C2D470JW01D; Package Size: 0805; JLCPCB Basic Part: No; JLCPCB Part Number: C162302; Supplier 1: LCSC; Category: Capacitors - MLCC; Supplier Part Number 1: C162302; Tolerance: ±5%; Voltage Rating: 200V; Temperature Coefficient: C0G; RoHS: Yes; ComponentLink1Description: Datasheet; ComponentLink1URL: https://wmsc.lcsc.com/wmsc/upload/file/pdf/v2/lcsc/2304140030_Murata-Electronics-GRM21A5C2D470JW01D_C162302.pdf; ComponentLink2Description: JLCPCB Part URL; ComponentLink2URL: https://jlcpcb.com/partdetail/C162302; ComponentLink3Description: LCSC Part URL; ComponentLink3URL: https://lcsc.com/product-detail/Multilayer-Ceramic-Capacitors-MLCC---SMD-SMT_Murata-Electronics-Murata-Electronics-GRM21A5C2D470JW01D_C162302.html
footprint CAP-0805 (0805 (2012M) Capacitor)
pins: 1, 2

## GRM21A5C2D680JW01D
designator C?  Capacitance: 68pF  (hidden comment: *)
Capacitor, Ceramic (MLCC), 68pF, ±5%, 200V, C0G, ±5%, SMD 0805; Manufacturer: Murata Electronics; Manufacturer Part Number: GRM21A5C2D680JW01D; Package Size: 0805; JLCPCB Basic Part: No; JLCPCB Part Number: C162303; Supplier 1: LCSC; Category: Capacitors - MLCC; Supplier Part Number 1: C162303; Tolerance: ±5%; Voltage Rating: 200V; Temperature Coefficient: C0G; RoHS: Yes; ComponentLink1Description: Datasheet; ComponentLink1URL: https://wmsc.lcsc.com/wmsc/upload/file/pdf/v2/lcsc/1810201241_Murata-Electronics-GRM21A5C2D680JW01D_C162303.pdf; ComponentLink2Description: JLCPCB Part URL; ComponentLink2URL: https://jlcpcb.com/partdetail/C162303; ComponentLink3Description: LCSC Part URL; ComponentLink3URL: https://lcsc.com/product-detail/Multilayer-Ceramic-Capacitors-MLCC---SMD-SMT_Murata-Electronics-Murata-Electronics-GRM21A5C2D680JW01D_C162303.html
footprint CAP-0805 (0805 (2012M) Capacitor)
pins: 1, 2

## GRM21A5C2E100JW01D
designator C?  Capacitance: 10pF  (hidden comment: *)
Capacitor, Ceramic (MLCC), 10pF, ±5%, 250V, null, ±5%, SMD 0805; Manufacturer: Murata Electronics; Manufacturer Part Number: GRM21A5C2E100JW01D; Package Size: 0805; JLCPCB Basic Part: No; JLCPCB Part Number: C913595; Supplier 1: LCSC; Category: Capacitors - MLCC; Supplier Part Number 1: C913595; Tolerance: ±5%; Voltage Rating: 250V; Temperature Coefficient: null; RoHS: Yes; ComponentLink1Description: Datasheet; ComponentLink1URL: https://wmsc.lcsc.com/wmsc/upload/file/pdf/v2/lcsc/2201131300_Murata-Electronics-GRM21A5C2E100JW01D_C913595.pdf; ComponentLink2Description: JLCPCB Part URL; ComponentLink2URL: https://jlcpcb.com/partdetail/C913595; ComponentLink3Description: LCSC Part URL; ComponentLink3URL: https://lcsc.com/product-detail/Multilayer-Ceramic-Capacitors-MLCC---SMD-SMT_Murata-Electronics-Murata-Electronics-GRM21A5C2E100JW01D_C913595.html
footprint CAP-0805 (0805 (2012M) Capacitor)
pins: 1, 2

## GRM21A5C2E101JW01D
designator C?  Capacitance: 100pF  (hidden comment: *)
Capacitor, Ceramic (MLCC), 100pF, ±5%, 250V, C0G, ±5%, SMD 0805; Manufacturer: Murata Electronics; Manufacturer Part Number: GRM21A5C2E101JW01D; Package Size: 0805; JLCPCB Basic Part: No; JLCPCB Part Number: C162304; Supplier 1: LCSC; Category: Capacitors - MLCC; Supplier Part Number 1: C162304; Tolerance: ±5%; Voltage Rating: 250V; Temperature Coefficient: C0G; RoHS: Yes; ComponentLink1Description: Datasheet; ComponentLink1URL: https://wmsc.lcsc.com/wmsc/upload/file/pdf/v2/lcsc/1810201241_Murata-Electronics-GRM21A5C2E101JW01D_C162304.pdf; ComponentLink2Description: JLCPCB Part URL; ComponentLink2URL: https://jlcpcb.com/partdetail/C162304; ComponentLink3Description: LCSC Part URL; ComponentLink3URL: https://lcsc.com/product-detail/Multilayer-Ceramic-Capacitors-MLCC---SMD-SMT_Murata-Electronics-Murata-Electronics-GRM21A5C2E101JW01D_C162304.html
footprint CAP-0805 (0805 (2012M) Capacitor)
pins: 1, 2